# Altium footprint library RODION.PcbLib: 131 footprints (part 1 of 9)
Each footprint in its own frame and in the unit in brackets; x right, y up, seen from the top. Pads: shape width x height; smd on the part's side, far side on the other; paste and mask are expansions set on the pad; w line width, h text height; cw(c..) or ccw(c..) is an arc to the next point about the centre after c.
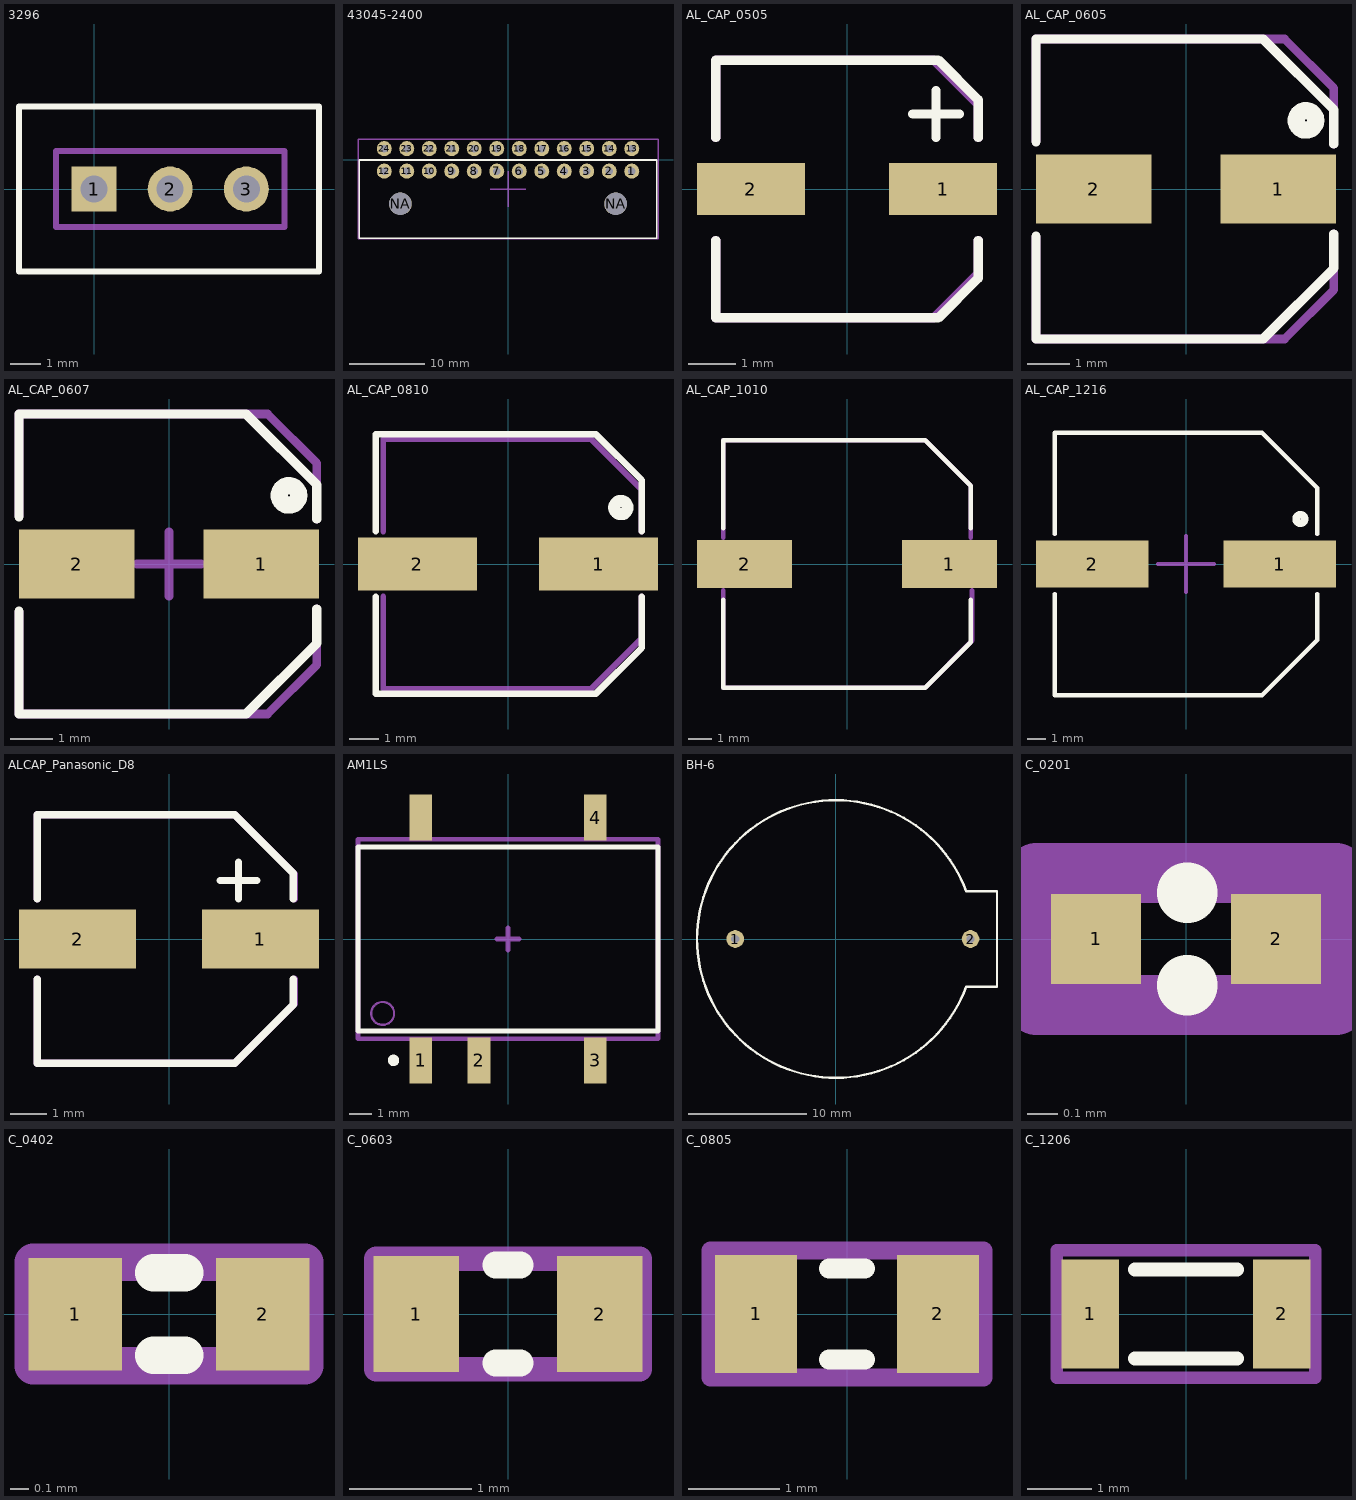
[diagram p0: the footprints below, top view; thin cyan lines are the x and y axes]

## 3296 [mm] "3296 Bourns resistor; 3 Position"
height 11.55
pads (3):
  rect 1.5x1.5 hole 0.9: 1(0,0)
  round 1.5 hole 0.9: 2(2.54,0) 3(5.08,0)
Top Overlay:
  lines w0.2: -2.5,-2.75 7.5,-2.75 7.5,2.75 -2.5,2.75 -2.5,-2.75
Top_Assy:
  lines w0.2: -1.275,-1.27 -1.275,1.27 6.345,1.27 6.345,-1.27 -1.275,-1.27
3D body "3296W Bourns.step": height 11.55, standoff -1.6, extent -2.225,-2.4 7.305,2.4

## 43045-2400 [mm] "43045-2400 Molex Connector"
height 8.8
pads (26):
  round 2 hole 1: 1(16.5,-1.5) 2(13.5,-1.5) 3(10.5,-1.5) 4(7.5,-1.5) 5(4.5,-1.5) 6(1.5,-1.5) 7(-1.5,-1.5) 8(-4.5,-1.5) 9(-7.5,-1.5) 10(-10.5,-1.5) 11(-13.5,-1.5) 12(-16.5,-1.5) 13(16.5,1.5) 14(13.5,1.5) 15(10.5,1.5) 16(7.5,1.5) 17(4.5,1.5) 18(1.5,1.5) 19(-1.5,1.5) 20(-4.5,1.5) 21(-7.5,1.5) 22(-10.5,1.5) 23(-13.5,1.5) 24(-16.5,1.5)
  round 3 hole 3: NA(-14.35,-5.85) NA(14.35,-5.85)
Top Overlay:
  lines w0.22: -19.85,-10.45 -19.85,0 19.85,0 19.85,-10.45 -19.85,-10.45
Top_Assy:
  lines w0.2: -2.375,-3.875 0,-3.875 ; 0,-6.25 0,-3.875 ; 0,-1.5 0,-3.875 ; 2.375,-3.875 0,-3.875 ; -20,-10.5 20,-10.5 20,2.75 -20,2.75 -20,-10.5
3D body "43045-2400.stp": height 8.75, standoff -3.19, extent -20.075,-10.425 20.075,1.815

## AL_CAP_0505 [mm] "Aluminium Cap ¦5.4mm"
height 5.4
pads (2):
  rect 2.3x1.1 smd: 1(2.05,0) 2(-2.05,0)
Top Overlay:
  lines w0.2: -2.8,-1.1 -2.8,-2.75 1.95,-2.75 2.8,-1.9 2.8,-1.1 ; -2.8,1.1 -2.8,2.75 1.95,2.75 2.8,1.9 2.8,1.1 ; 1.4,1.6 2.4,1.6 ; 1.9,1.1 1.9,2.1
Top_Assy:
  lines w0.2: -2.8,-1.1 -2.8,-2.75 1.85,-2.75 2.8,-1.8 2.8,-1.1 ; -2.8,1.1 -2.8,2.75 1.85,2.75 2.8,1.8 2.8,1.1
  text ".Designator" at -2.375,-0.525 h1
3D body "5x5_4.STEP": height 5.7, standoff 0, extent -3.15,-2.65 3.15,2.65

## AL_CAP_0605 [mm] "Aluminium Cap ¦6.6mm"
height 5.4
pads (2):
  rect 2.7x1.6 smd: 1(2.15,0) 2(-2.15,0)
Top Overlay:
  circle w0.4: c2.8,1.6 r0.227
  lines w0.22: -3.5,-1.1 -3.5,-3.5 1.8,-3.5 3.45,-1.85 3.45,-1.05 ; -3.5,1.1 -3.5,3.5 1.8,3.5 3.45,1.85 3.45,1.05
Top_Assy:
  lines w0.2: -3.5,-1.125 -3.5,-2.025 -3.5,-3.5 2.3,-3.5 3.45,-2.35 3.45,-1.05 ; -3.5,1.125 -3.5,2.025 -3.5,3.5 2.3,3.5 3.45,2.35 3.45,1.05
  text ".Designator" at -2.6,-0.3 h1
3D body "CC0607.STEP": height 8.11, standoff 0, extent -3.5,-3.3 3.5,3.3

## AL_CAP_0607 [mm] "Aluminium Cap ¦6.6mm"
height 7.8
pads (2):
  rect 2.7x1.6 smd: 1(2.15,0) 2(-2.15,0)
Top Overlay:
  circle w0.4: c2.8,1.6 r0.227
  lines w0.22: -3.5,-1.1 -3.5,-3.5 1.8,-3.5 3.45,-1.85 3.45,-1.05 ; -3.5,1.1 -3.5,3.5 1.8,3.5 3.45,1.85 3.45,1.05
Top_Assy:
  lines w0.2: -3.5,-1.125 -3.5,-2.025 -3.5,-3.5 2.3,-3.5 3.45,-2.35 3.45,-1.05 ; -3.5,1.125 -3.5,2.025 -3.5,3.5 2.3,3.5 3.45,2.35 3.45,1.05 ; -0.75,0 0,0 ; 0,-0.75 0,0 ; 0,0.75 0,0 ; 0.75,0 0,0
3D body "CC0607.STEP": height 8.11, standoff 0, extent -3.5,-3.3 3.5,3.3

## AL_CAP_0810 [mm] "Aluminium Cap ¦10mm"
height 10
pads (2):
  rect 4x1.8 smd: 1(3.05,0) 2(-3.05,0)
Top Overlay:
  circle w0.4: c3.8,1.9 r0.227
  lines w0.22: -4.45,-1.1 -4.45,-4.375 2.95,-4.375 4.5,-2.825 4.5,-1.1 ; -4.45,1.1 -4.45,4.375 2.95,4.375 4.5,2.825 4.5,1.1
Top_Assy:
  lines w0.2: -4.2,-1.1 -4.2,-4.2 2.6,-4.2 2.8,-4.2 4.5,-2.5 4.5,-1.1 ; -4.2,1.1 -4.2,4.2 2.6,4.2 2.8,4.2 4.5,2.5 4.5,1.1
  text ".Designator" at -2.65,0 h1
3D body "AL_EL_cap_8mmx10mm.STEP": height 10.3, standoff -0.2, extent -4.848,-4.25 4.852,4.25

## AL_CAP_1010 [mm] "Aluminium Cap ¦10mm"
height 10
pads (2):
  rect 4x2 smd: 1(4.3,0) 2(-4.3,0)
Top Overlay:
  lines w0.2: -5.2,-1.5 -5.2,-5.2 3.277,-5.2 5.2,-3.277 5.2,-1.5 ; -5.2,1.5 -5.2,5.2 3.277,5.2 5.2,3.277 5.2,1.5
Top_Assy:
  lines w0.2: -5.2,-1.1 -5.2,-5.2 2.8,-5.2 3.277,-5.2 5.25,-3.227 5.25,-1.1 ; -5.2,1.1 -5.2,5.2 2.8,5.2 3.277,5.2 5.2,3.277 5.2,1.1
  text ".Designator" at -3.15,-0.275 h1
3D body "CAP_10x10x10.STEP": height 10.3, standoff -0.2, extent -5.899,-5.25 5.901,5.25

## AL_CAP_1216 [mm] "Aluminium Cap ¦13.6mm"
height 16
pads (2):
  rect 6x2.5 smd: 1(5,0) 2(-5,0)
Top Overlay:
  circle w0.4: c6.1,2.4 r0.227
  lines w0.22: -7,-1.6 -7,-7 4.05,-7 7,-4.05 7,-1.6 ; -7,1.6 -7,7 4.05,7 7,4.05 7,1.6
Top_Assy:
  lines w0.2: -7,-1.6 -7,-7 4.05,-7 7,-4.05 7,-1.6 ; -7,1.6 -7,7 4.05,7 7,4.05 7,1.6 ; -1.5,0 0,0 ; 0,-1.5 0,0 ; 0,1.5 0,0 ; 1.5,0 0,0
3D body "ALU-H16.STEP": height 17, standoff 0, extent -7.75,-6.85 7.75,6.85

## ALCAP_Panasonic_D8 [mm] "Aluminium Cap 6.3mm"
height 7.7
pads (2):
  rect 3.2x1.6 smd: 1(2.5,0) 2(-2.5,0)
Top Overlay:
  lines w0.2: -3.6,-1.1 -3.6,-3.4 1.8,-3.4 3.4,-1.8 3.4,-1.1 ; -3.6,1.1 -3.6,3.4 1.8,3.4 3.4,1.8 3.4,1.1 ; 1.4,1.6 2.4,1.6 ; 1.9,1.1 1.9,2.1
Top_Assy:
  lines w0.2: -3.6,-1.1 -3.6,-3.4 1.8,-3.4 3.425,-1.775 3.425,-1.1 ; -3.6,1.1 -3.6,3.4 1.8,3.4 3.425,1.775 3.425,1.1
  text ".Designator" at -2.375,-0.525 h1
3D body "CC0607.STEP": height 8.11, standoff 0, extent -3.5,-3.3 3.5,3.3

## AM1LS [mm] "SOT23, 6-Leads, Body 2.9x1.6mm, Pitch 0.95mm, Lead Span 2.7mm, IPC Medium Density"
height 7.25
pads (5):
  rect 1x2 smd: 1(-3.81,-5.3) 2(-1.27,-5.3) 3(3.81,-5.3) 4(3.81,5.3) ""(-3.81,5.3)
Top Overlay:
  circle w0.25: c-5,-5.3 r0.125
  lines w0.22: -6.55,-4.025 6.55,-4.025 6.55,4.025 -6.55,4.025 -6.55,-4.025
Top_Assy:
  circle w0.1: c-5.475,-3.25 r0.5
  lines w0.2: -0.5,0 0.5,0 ; 0,-0.5 0,0.5 ; -6.55,-4.35 6.55,-4.35 ; -6.55,-4.35 -6.55,4.35 ; -6.55,-4.35 6.55,-4.35 ; -6.55,-4.35 -6.55,4.35 ; -6.55,4.35 6.55,4.35 ; -6.55,4.35 6.55,4.35 ; 6.55,-4.35 6.55,4.35 ; 6.55,-4.35 6.55,4.35
3D body "AM1L-0303S-NZ-214.STEP": height 6.24, standoff -0.01, extent -6.35,-5.6 6.35,5.6

## BH-6 [mm] "CR2032 Battery Holder"
height 7.6
pads (2):
  round 1.5 hole 0.7: 1(-8.55,0) 2(11.45,0)
Top Overlay:
  lines w0.2: 11.088,-4.036 cw(c0,0) 11.088,4.036 ; 11.1,-4.05 13.7,-4.05 13.7,4.05 11.1,4.05
3D body "BH-6.step": height 8.5, standoff -4, extent -11,-11 13.5,11

## C_0201 [mm] "Chip, Body 0.6x0.3mm, IPC High Density"
height 0.23
pads (2):
  rect 0.3x0.3 smd mask+0.05: 1(-0.3,0) 2(0.3,0)
Top Overlay:
  circle w0.2: c0.005,0.154 r0.001
  circle w0.2: c0.005,-0.154 r0.001
Top_Assy:
  lines w0.2: -0.5,-0.22 -0.5,0.22 0.5,0.22 0.5,-0.22 -0.5,-0.22
3D body "CAP0201.STEP": height 0.29, standoff -0.01, extent -0.3,-0.154 0.31,0.154

## C_0402 [mm] "Chip, Body 1.6x0.85mm, IPC High Density"
height 0.9
pads (2):
  rect 0.5x0.6 smd mask+0.05: 1(-0.5,0) 2(0.5,0)
Top Overlay:
  lines w0.2: -0.083,-0.22 0.083,-0.22 ; -0.083,0.22 0.083,0.22
Top_Assy:
  lines w0.2: -0.725,-0.275 -0.725,0.275 0.725,0.275 0.725,-0.275 -0.725,-0.275
  text ".Designator" at -0.525,-0.1 h1
3D body "CAP0402.stp": height 0.2, standoff 0, extent -0.5,-0.3 0.5,0.3

## C_0603 [mm] "Chip, Body 1.6x0.85mm, IPC High Density"
height 0.9
pads (2):
  rect 0.7x0.95 smd mask+0.05: 1(-0.75,0) 2(0.75,0)
Top Overlay:
  lines w0.22: -0.1,-0.4 0.1,-0.4 ; -0.1,0.4 0.1,0.4
Top_Assy:
  lines w0.2: -1.075,-0.45 1.075,-0.45 1.075,0.45 -1.075,0.45 -1.075,-0.45
  text ".Designator" at -0.9,-0.2 h1
3D body "CAP0603.stp": height 0.3, standoff 0, extent -0.8,-0.4 0.8,0.4

## C_0805 [mm] "Chip, Body 1.6x0.85mm, IPC High Density"
height 0.45
pads (2):
  rect 0.9x1.3 smd: 1(-1,0) 2(1,0)
Top Overlay:
  lines w0.22: -0.2,-0.5 0.2,-0.5 ; -0.2,0.5 0.2,0.5
Top_Assy:
  lines w0.2: -1.5,-0.7 -1.5,0.7 1.5,0.7 1.5,-0.7 -1.5,-0.7
  text ".Designator" at -1.225,-0.375 h1
3D body "CAP0805.stp": height 0.78, standoff 0, extent -1,-0.625 1,0.625

## C_1206 [mm] "Chip, Body 3.2x1.6mm, IPC High Density"
height 1.5
pads (2):
  rect 0.9x1.7 smd: 1(-1.5,0) 2(1.5,0)
Top Overlay:
  lines w0.22: -0.8,-0.7 0.8,-0.7 ; -0.8,0.7 0.8,0.7
Top_Assy:
  lines w0.2: -2.025,-1 -2.025,1 2.025,1 2.025,-1 -2.025,-1
  text ".Designator" at -1.65,-0.55 h1
3D body "CAP1206.stp": height 1, standoff 0, extent -1.6,-0.8 1.6,0.8